# Altium footprint library Reflow3D1411sep.PcbLib: 657 footprints (part 8 of 42)
Each footprint in its own frame and in the unit in brackets; x right, y up, seen from the top. Pads: shape width x height; smd on the part's side, far side on the other; paste and mask are expansions set on the pad; w line width, h text height; cw(c..) or ccw(c..) is an arc to the next point about the centre after c.
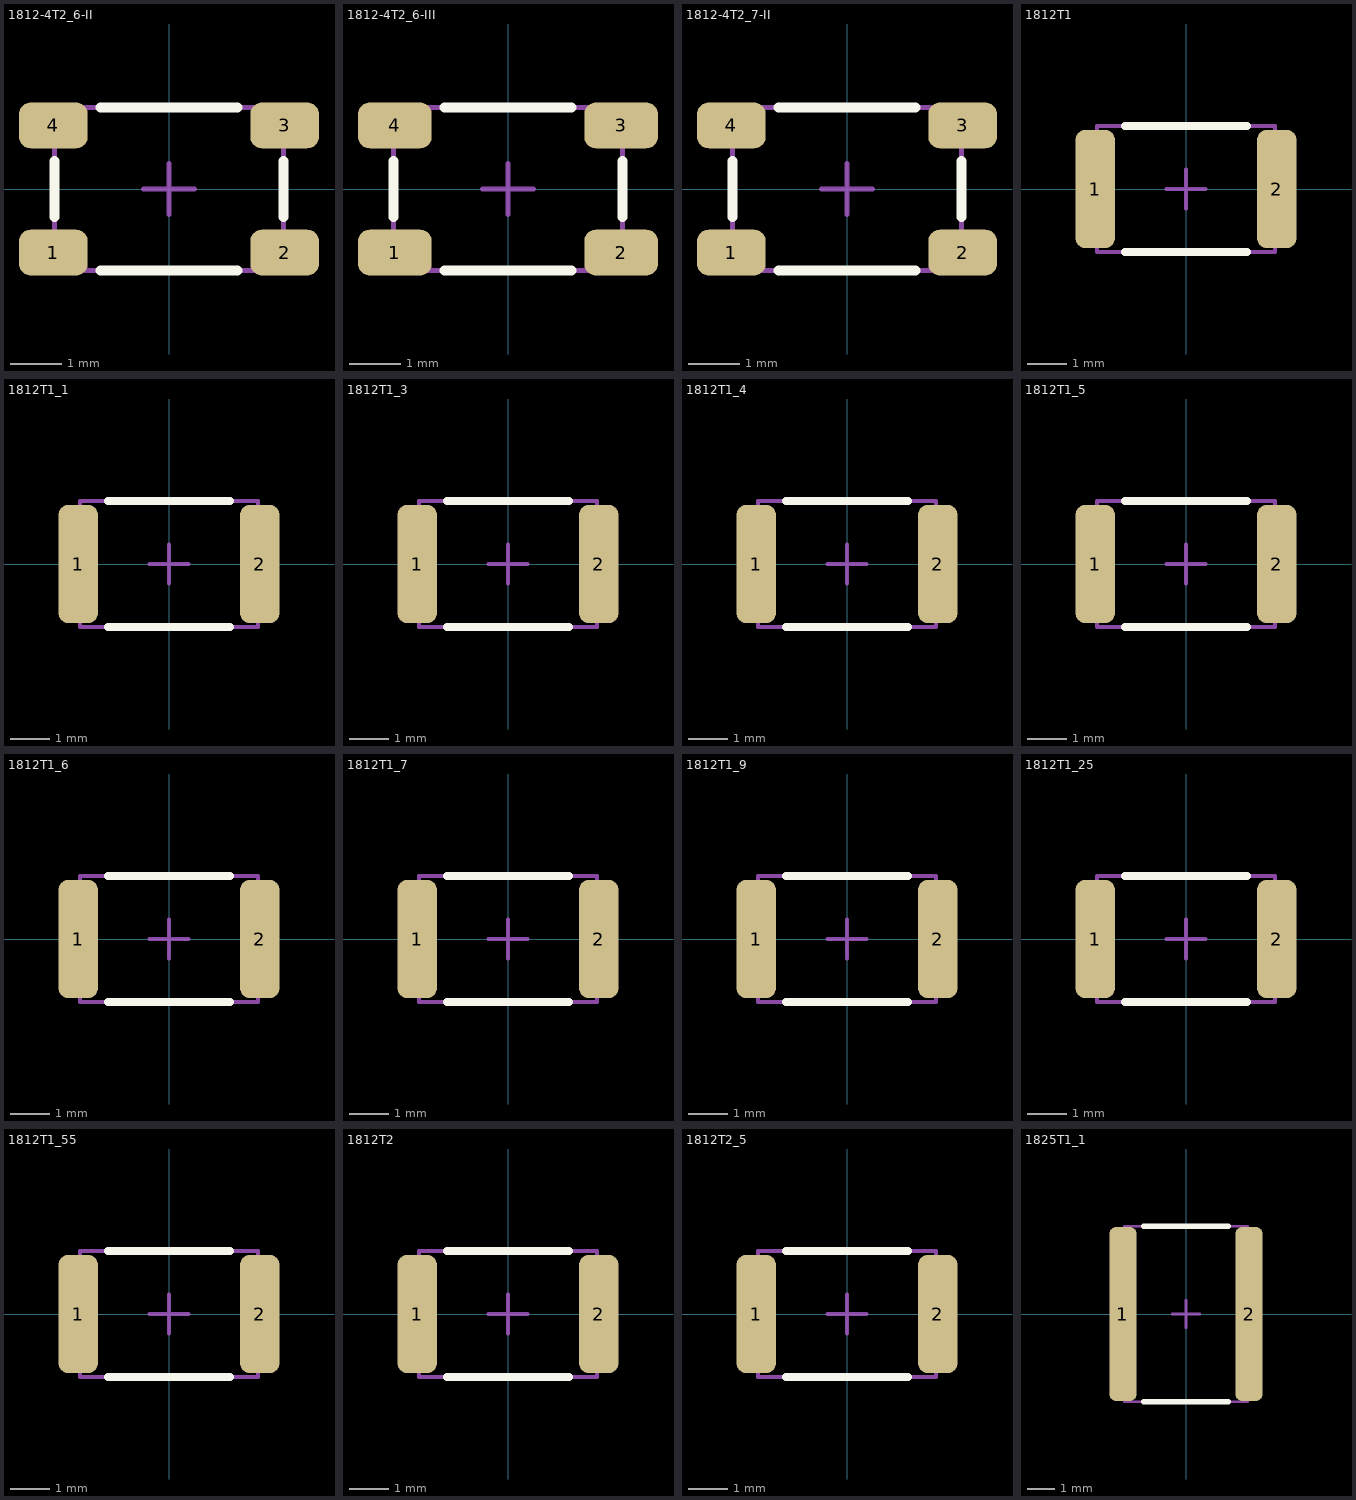
[diagram p7: the footprints below, top view; thin cyan lines are the x and y axes]

## 1812-4T2_6-II [mm] "www.murata.com, c50e.pdf, DLW43S(101)"
height 2.6
pads (4):
  rrect50% 1.35x0.9 smd mask+0.075: 1(-2.275,-1.25) 2(2.275,-1.25) 3(2.275,1.25) 4(-2.275,1.25)
Top Overlay:
  lines w0.2: -2.25,-0.55 -2.25,0.55 ; -1.35,-1.6 1.35,-1.6 ; -1.35,1.6 1.35,1.6 ; 2.25,-0.55 2.25,0.55
Mechanical 13:
  lines w0.1: -2.25,-1.6 -2.25,1.6 2.25,1.6 2.25,-1.6 -2.25,-1.6
Mechanical 15:
  lines w0.1: -0.5,0 0.5,0 ; 0,-0.5 0,0.5
3D body: height 2.8, standoff 0, extent -2.35,-1.7 2.35,1.7

## 1812-4T2_6-III [mm] "www.murata.com, c50e.pdf, DLW43S(510)"
height 2.6
pads (4):
  rrect50% 1.45x0.9 smd mask+0.075: 1(-2.225,-1.25) 2(2.225,-1.25) 3(2.225,1.25) 4(-2.225,1.25)
Top Overlay:
  lines w0.2: -2.25,-0.55 -2.25,0.55 ; -1.25,-1.6 1.25,-1.6 ; -1.25,1.6 1.25,1.6 ; 2.25,-0.55 2.25,0.55
Mechanical 13:
  lines w0.1: -2.25,-1.6 2.25,-1.6 2.25,1.6 -2.25,1.6 -2.25,-1.6
Mechanical 15:
  lines w0.1: -0.5,0 0.5,0 ; 0,-0.5 0,0.5
3D body: height 2.8, standoff 0, extent -2.35,-1.7 2.35,1.7

## 1812-4T2_7-II [mm] "www.murata.com, c50e.pdf, DLW43S(101)"
height 2.7
pads (4):
  rrect50% 1.35x0.9 smd mask+0.075: 1(-2.275,-1.25) 2(2.275,-1.25) 3(2.275,1.25) 4(-2.275,1.25)
Top Overlay:
  lines w0.2: -2.25,-0.55 -2.25,0.55 ; -1.35,-1.6 1.35,-1.6 ; -1.35,1.6 1.35,1.6 ; 2.25,-0.55 2.25,0.55
Mechanical 13:
  lines w0.1: -2.25,-1.6 2.25,-1.6 2.25,1.6 -2.25,1.6 -2.25,-1.6
Mechanical 15:
  lines w0.1: -0.5,0 0.5,0 ; 0,-0.5 0,0.5
3D body: height 2.9, standoff 0, extent -2.35,-1.7 2.35,1.7

## 1812T1 [mm] "www.avx.com, smccp.pdf; www.kemet.com, F3102_C0G.pdf"
height 1
pads (2):
  rrect50% 1x3 smd mask+0.075: 1(-2.3,0) 2(2.3,0)
Top Overlay:
  lines w0.2: -1.55,-1.6 1.55,-1.6 ; -1.55,1.6 1.55,1.6
Mechanical 13:
  lines w0.1: -2.25,-1.6 2.25,-1.6 2.25,1.6 -2.25,1.6 -2.25,-1.6
Mechanical 15:
  lines w0.1: -0.5,0 0.5,0 ; 0,-0.5 0,0.5
3D body: height 1.1, standoff 0, extent -2.4,-1.75 2.4,1.75

## 1812T1_1 [mm] "www.avx.com, smccp.pdf; www.kemet.com, F3102_C0G.pdf"
height 1.1
pads (2):
  rrect50% 1x3 smd mask+0.075: 1(-2.3,0) 2(2.3,0)
Top Overlay:
  lines w0.2: -1.55,-1.6 1.55,-1.6 ; -1.55,1.6 1.55,1.6
Mechanical 13:
  lines w0.1: -2.25,-1.6 2.25,-1.6 2.25,1.6 -2.25,1.6 -2.25,-1.6
Mechanical 15:
  lines w0.1: -0.5,0 0.5,0 ; 0,-0.5 0,0.5
3D body: height 1.2, standoff 0, extent -2.4,-1.75 2.4,1.75

## 1812T1_3 [mm] "www.avx.com, smccp.pdf; www.kemet.com, F3102_C0G.pdf"
height 1.3
pads (2):
  rrect50% 1x3 smd mask+0.075: 1(-2.3,0) 2(2.3,0)
Top Overlay:
  lines w0.2: -1.55,-1.6 1.55,-1.6 ; -1.55,1.6 1.55,1.6
Mechanical 13:
  lines w0.1: -2.25,-1.6 -2.25,1.6 2.25,1.6 2.25,-1.6 -2.25,-1.6
Mechanical 15:
  lines w0.1: -0.5,0 0.5,0 ; 0,-0.5 0,0.5
3D body: height 1.4, standoff 0, extent -2.4,-1.75 2.4,1.75

## 1812T1_4 [mm] "www.avx.com, smccp.pdf; www.kemet.com, F3102_C0G.pdf"
height 1.4
pads (2):
  rrect50% 1x3 smd mask+0.075: 1(-2.3,0) 2(2.3,0)
Top Overlay:
  lines w0.2: -1.55,-1.6 1.55,-1.6 ; -1.55,1.6 1.55,1.6
Mechanical 13:
  lines w0.1: -2.25,-1.6 -2.25,1.6 2.25,1.6 2.25,-1.6 -2.25,-1.6
Mechanical 15:
  lines w0.1: -0.5,0 0.5,0 ; 0,-0.5 0,0.5
3D body: height 1.55, standoff 0, extent -2.4,-1.75 2.4,1.75

## 1812T1_5 [mm] "www.avx.com, smccp.pdf; www.kemet.com, F3102_C0G.pdf"
height 1.5
pads (2):
  rrect50% 1x3 smd mask+0.075: 1(-2.3,0) 2(2.3,0)
Top Overlay:
  lines w0.2: -1.55,-1.6 1.55,-1.6 ; -1.55,1.6 1.55,1.6
Mechanical 13:
  lines w0.1: -2.25,-1.6 -2.25,1.6 2.25,1.6 2.25,-1.6 -2.25,-1.6
Mechanical 15:
  lines w0.1: -0.5,0 0.5,0 ; 0,-0.5 0,0.5
3D body: height 1.6, standoff 0, extent -2.4,-1.75 2.4,1.75

## 1812T1_6 [mm] "www.avx.com, smccp.pdf; www.kemet.com, F3102_C0G.pdf"
height 1.6
pads (2):
  rrect50% 1x3 smd mask+0.075: 1(-2.3,0) 2(2.3,0)
Top Overlay:
  lines w0.2: -1.55,-1.6 1.55,-1.6 ; -1.55,1.6 1.55,1.6
Mechanical 13:
  lines w0.1: -2.25,-1.6 2.25,-1.6 2.25,1.6 -2.25,1.6 -2.25,-1.6
Mechanical 15:
  lines w0.1: -0.5,0 0.5,0 ; 0,-0.5 0,0.5
3D body: height 1.8, standoff 0, extent -2.4,-1.75 2.4,1.75

## 1812T1_7 [mm] "www.avx.com, smccp.pdf; www.kemet.com, F3102_C0G.pdf"
height 1.7
pads (2):
  rrect50% 1x3 smd mask+0.075: 1(-2.3,0) 2(2.3,0)
Top Overlay:
  lines w0.2: -1.55,-1.6 1.55,-1.6 ; -1.55,1.6 1.55,1.6
Mechanical 13:
  lines w0.1: -2.25,-1.6 -2.25,1.6 2.25,1.6 2.25,-1.6 -2.25,-1.6
Mechanical 15:
  lines w0.1: -0.5,0 0.5,0 ; 0,-0.5 0,0.5
3D body: height 1.85, standoff 0, extent -2.4,-1.75 2.4,1.75

## 1812T1_9 [mm] "www.avx.com, smccp.pdf; www.kemet.com, F3102_C0G.pdf"
height 1.9
pads (2):
  rrect50% 1x3 smd mask+0.075: 1(-2.3,0) 2(2.3,0)
Top Overlay:
  lines w0.2: -1.55,-1.6 1.55,-1.6 ; -1.55,1.6 1.55,1.6
Mechanical 13:
  lines w0.1: -2.25,-1.6 -2.25,1.6 2.25,1.6 2.25,-1.6 -2.25,-1.6
Mechanical 15:
  lines w0.1: -0.5,0 0.5,0 ; 0,-0.5 0,0.5
3D body: height 2.1, standoff 0, extent -2.4,-1.75 2.4,1.75

## 1812T1_25 [mm] "www.avx.com, smccp.pdf; www.kemet.com, F3102_C0G.pdf"
height 1.25
pads (2):
  rrect50% 1x3 smd mask+0.075: 1(-2.3,0) 2(2.3,0)
Top Overlay:
  lines w0.2: -1.55,-1.6 1.55,-1.6 ; -1.55,1.6 1.55,1.6
Mechanical 13:
  lines w0.1: -2.25,-1.6 -2.25,1.6 2.25,1.6 2.25,-1.6 -2.25,-1.6
Mechanical 15:
  lines w0.1: -0.5,0 0.5,0 ; 0,-0.5 0,0.5
3D body: height 1.4, standoff 0, extent -2.4,-1.75 2.4,1.75

## 1812T1_55 [mm] "www.avx.com, smccp.pdf; www.kemet.com, F3102_C0G.pdf"
height 1.55
pads (2):
  rrect50% 1x3 smd mask+0.075: 1(-2.3,0) 2(2.3,0)
Top Overlay:
  lines w0.2: -1.55,-1.6 1.55,-1.6 ; -1.55,1.6 1.55,1.6
Mechanical 13:
  lines w0.1: -2.25,-1.6 -2.25,1.6 2.25,1.6 2.25,-1.6 -2.25,-1.6
Mechanical 15:
  lines w0.1: -0.5,0 0.5,0 ; 0,-0.5 0,0.5
3D body: height 1.65, standoff 0, extent -2.4,-1.75 2.4,1.75

## 1812T2 [mm] "www.avx.com, smccp.pdf; www.kemet.com, F3102_C0G.pdf"
height 2
pads (2):
  rrect50% 1x3 smd mask+0.075: 1(-2.3,0) 2(2.3,0)
Top Overlay:
  lines w0.2: -1.55,-1.6 1.55,-1.6 ; -1.55,1.6 1.55,1.6
Mechanical 13:
  lines w0.1: -2.25,-1.6 -2.25,1.6 2.25,1.6 2.25,-1.6 -2.25,-1.6
Mechanical 15:
  lines w0.1: -0.5,0 0.5,0 ; 0,-0.5 0,0.5
3D body: height 2.2, standoff 0, extent -2.4,-1.75 2.4,1.75

## 1812T2_5 [mm] "www.avx.com, smccp.pdf; www.kemet.com, F3102_C0G.pdf"
height 2.5
pads (2):
  rrect50% 1x3 smd mask+0.075: 1(-2.3,0) 2(2.3,0)
Top Overlay:
  lines w0.2: -1.55,-1.6 1.55,-1.6 ; -1.55,1.6 1.55,1.6
Mechanical 13:
  lines w0.1: -2.25,-1.6 2.25,-1.6 2.25,1.6 -2.25,1.6 -2.25,-1.6
Mechanical 15:
  lines w0.1: -0.5,0 0.5,0 ; 0,-0.5 0,0.5
3D body: height 2.7, standoff 0, extent -2.4,-1.75 2.4,1.75

## 1825T1_1 [mm] "www.avx.com, smccp.pdf; www.kemet.com, F3102_C0G.pdf"
height 1.1
pads (2):
  rrect50% 1x6.35 smd mask+0.075: 1(-2.3,0) 2(2.3,0)
Top Overlay:
  lines w0.2: -1.55,-3.2 1.55,-3.2 ; -1.55,3.2 1.55,3.2
Mechanical 13:
  lines w0.1: -2.25,-3.2 -2.25,3.2 2.25,3.2 2.25,-3.2 -2.25,-3.2
Mechanical 15:
  lines w0.1: -0.5,0 0.5,0 ; 0,-0.5 0,0.5
3D body: height 1.25, standoff 0, extent -2.4,-3.4 2.4,3.4